# Altium footprint library 模块.PcbLib: 1 footprints
Each footprint in its own frame and in the unit in brackets; x right, y up, seen from the top. Pads: shape width x height; smd on the part's side, far side on the other; paste and mask are expansions set on the pad; w line width, h text height; cw(c..) or ccw(c..) is an arc to the next point about the centre after c.
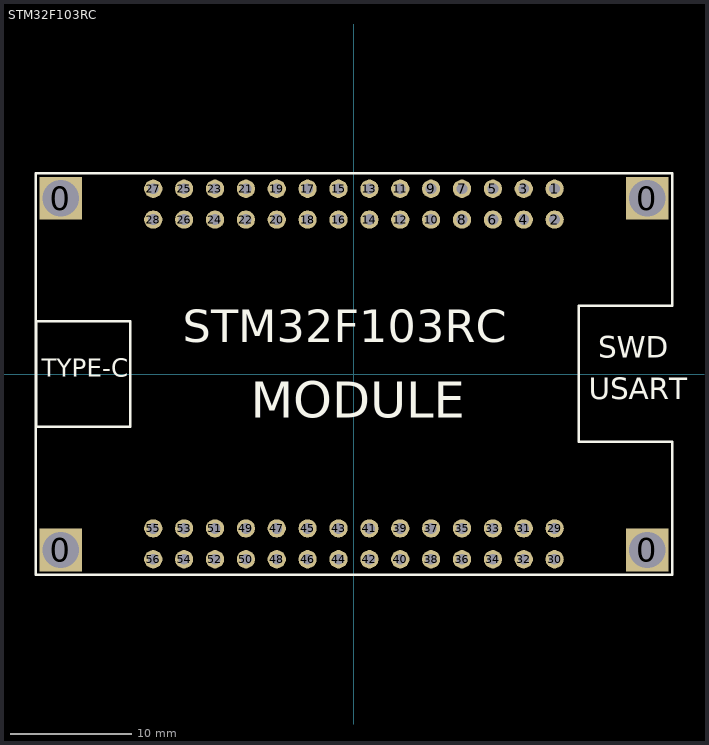
[diagram p0: the footprint, top view; thin cyan lines are the x and y axes]

## STM32F103RC [mm]
pads (60):
  rect 3.5x3.5 hole 3: 0(-24.13,-14.478) 0(-24.13,14.453) 0(24.13,-14.478) 0(24.13,14.453)
  round 1.5 hole 0.9: 1(16.51,15.24) 2(16.51,12.7) 3(13.97,15.24) 4(13.97,12.7) 5(11.43,15.24) 6(11.43,12.7) 7(8.89,15.24) 8(8.89,12.7) 9(6.35,15.24) 10(6.35,12.7) 11(3.81,15.24) 12(3.81,12.7) 13(1.27,15.24) 14(1.27,12.7) 15(-1.27,15.24) 16(-1.27,12.7) 17(-3.81,15.24) 18(-3.81,12.7) 19(-6.35,15.24) 20(-6.35,12.7) 21(-8.89,15.24) 22(-8.89,12.7) 23(-11.43,15.24) 24(-11.43,12.7) 25(-13.97,15.24) 26(-13.97,12.7) 27(-16.51,15.24) 28(-16.51,12.7) 29(16.51,-12.7) 30(16.51,-15.24) 31(13.97,-12.7) 32(13.97,-15.24) 33(11.43,-12.7) 34(11.43,-15.24) 35(8.89,-12.7) 36(8.89,-15.24) 37(6.35,-12.7) 38(6.35,-15.24) 39(3.81,-12.7) 40(3.81,-15.24) 41(1.27,-12.7) 42(1.27,-15.24) 43(-1.27,-12.7) 44(-1.27,-15.24) 45(-3.81,-12.7) 46(-3.81,-15.24) 47(-6.35,-12.7) 48(-6.35,-15.24) 49(-8.89,-12.7) 50(-8.89,-15.24) 51(-11.43,-12.7) 52(-11.43,-15.24) 53(-13.97,-12.7) 54(-13.97,-15.24) 55(-16.51,-12.7) 56(-16.51,-15.24)
Top Overlay:
  lines w0.203: -19.543,-4.326 -26.143,-4.326 ; -19.543,4.324 -26.143,4.324 ; -26.143,-4.326 -26.143,4.324 ; -26.143,-4.326 -18.415,-4.326 -18.415,4.305 -18.415,4.324 -26.143,4.324 ; -26.17,-16.51 -26.17,16.51 26.18,16.51 26.18,5.607 18.486,5.607 18.486,-5.593 26.18,-5.593 26.18,-16.51 -26.17,-16.51
  text "TYPE-C" at -25.7,-0.7 h2.5
  text "SWD" at 20.088,0.722 h3.05
  text "USART" at 19.326,-2.707 h3.05
  text "STM32F103RC" at -14.1,1.7 h4.57
  text "MODULE" at -8.5,-4.6 h5.08